# Altium footprint library 6-Connectors-3.PcbLib: 153 footprints (part 5 of 11)
Each footprint in its own frame and in the unit in brackets; x right, y up, seen from the top. Pads: shape width x height; smd on the part's side, far side on the other; paste and mask are expansions set on the pad; w line width, h text height; cw(c..) or ccw(c..) is an arc to the next point about the centre after c.
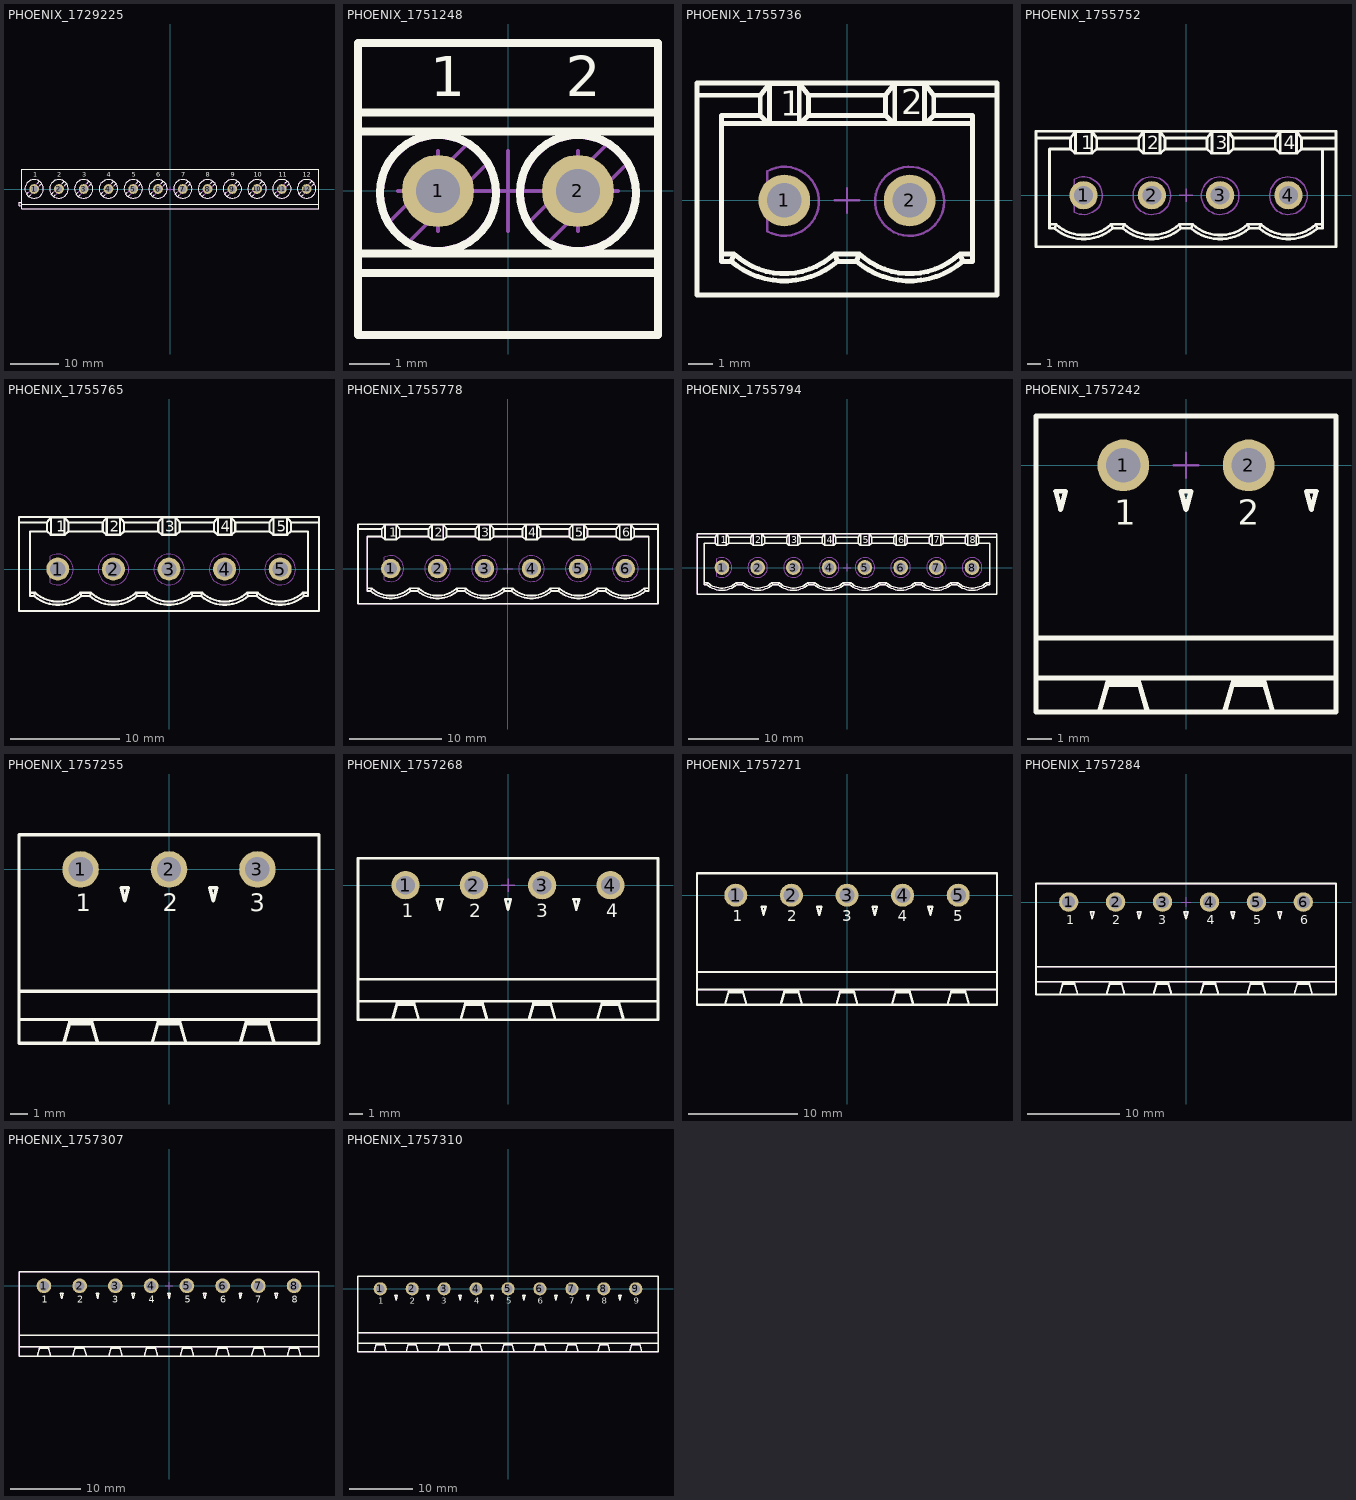
[diagram p4: the footprints below, top view; thin cyan lines are the x and y axes]

## PHOENIX_1729225 [mm] "Terminal Block, 13.5A 400V, Pitch 5.08mm, 12 Positions, Screw Connection"
height 10
pads (12):
  round 2 hole 1.3: 1(-27.94,0) 2(-22.86,0) 3(-17.78,0) 4(-12.7,0) 5(-7.62,0) 6(-2.54,0) 7(2.54,0) 8(7.62,0) 9(12.7,0) 10(17.78,0) 11(22.86,0) 12(27.94,0)
Top Overlay:
  circle w0.2: c27.94,0.05 r1.9
  circle w0.2: c22.86,0.05 r1.9
  circle w0.2: c17.78,0.025 r1.9
  circle w0.2: c12.7,0.025 r1.9
  circle w0.2: c7.62,0.025 r1.9
  circle w0.2: c2.54,0.025 r1.9
  circle w0.2: c-2.54,0.025 r1.9
  circle w0.2: c-7.62,0.025 r1.9
  circle w0.2: c-12.7,0.025 r1.9
  circle w0.2: c-17.78,0.025 r1.9
  circle w0.2: c-22.86,0.025 r1.9
  circle w0.2: c-27.94,0.025 r1.9
  lines w0.2: -30.48,-3.327 -30.609,-3.327 -30.787,-3.477 -31.05,-3.477 -31.05,-2.763 -30.787,-2.763 -30.609,-2.913 -30.48,-2.913 ; -30.48,-3.128 30.48,-3.128 ; -29.508,-1.048 -29.155,-0.695 ; -29.013,-1.543 -28.667,-1.197 ; -27.245,1.215 -26.867,1.593 ; -26.743,0.727 -26.372,1.098 ; -24.428,-1.048 -24.075,-0.695 ; -23.933,-1.543 -23.587,-1.197 ; -22.165,1.215 -21.787,1.593 ; -21.663,0.727 -21.292,1.098 ; -19.348,-1.048 -18.995,-0.695 ; -18.853,-1.543 -18.507,-1.197 ; -17.085,1.215 -16.707,1.593 ; -16.583,0.727 -16.212,1.098 ; -14.268,-1.048 -13.915,-0.695 ; -13.773,-1.543 -13.427,-1.197 ; -12.005,1.215 -11.627,1.593 ; -11.503,0.727 -11.132,1.098 ; -9.188,-1.048 -8.835,-0.695 ; -8.693,-1.543 -8.347,-1.197 ; -6.925,1.215 -6.547,1.593 ; -6.423,0.727 -6.052,1.098 ; -4.108,-1.048 -3.755,-0.695 ; -3.613,-1.543 -3.267,-1.197 ; -1.845,1.215 -1.467,1.593 ; -1.343,0.727 -0.972,1.098 ; 0.972,-1.048 1.325,-0.695 ; 1.467,-1.543 1.813,-1.197 ; 3.235,1.215 3.613,1.593 ; 3.737,0.727 4.108,1.098 ; 6.052,-1.048 6.405,-0.695 ; 6.547,-1.543 6.893,-1.197 ; 8.315,1.215 8.693,1.593 ; 8.817,0.727 9.188,1.098 ; 11.132,-1.048 11.485,-0.695 ; 11.627,-1.543 11.973,-1.197 ; 13.395,1.215 13.773,1.593 ; 13.897,0.727 14.268,1.098 ; 16.212,-1.048 16.565,-0.695 ; 16.707,-1.543 17.053,-1.197 ; 18.475,1.215 18.853,1.593 ; 18.977,0.727 19.348,1.098 ; 21.292,-1.023 21.645,-0.67 ; 21.787,-1.518 22.133,-1.172 ; 23.555,1.24 23.933,1.618 ; 24.057,0.752 24.428,1.123 ; 26.372,-1.023 26.725,-0.67 ; 26.867,-1.518 27.213,-1.172 ; 28.635,1.24 29.013,1.618 ; 29.137,0.752 29.508,1.123 ; -30.48,-4.05 -30.48,4.05 30.48,4.05 30.48,-4.05 -30.48,-4.05
  text "12" at 27.146,2.508 h1
  text "11" at 22.225,2.508 h1
  text "10" at 17.145,2.508 h1
  text "9" at 12.383,2.508 h1
  text "1" at -28.099,2.508 h1
  text "2" at -23.177,2.508 h1
  text "3" at -18.097,2.508 h1
  text "4" at -13.017,2.508 h1
  text "5" at -7.937,2.508 h1
  text "6" at -2.857,2.508 h1
  text "7" at 2.223,2.508 h1
  text "8" at 7.303,2.508 h1
Mechanical 8:
  lines w0.1: -28.44,0 -27.94,0 ; -27.94,-0.5 -27.94,0 ; -27.94,0.5 -27.94,0 ; -27.44,0 -27.94,0 ; -23.36,0 -22.86,0 ; -22.86,-0.5 -22.86,0 ; -22.86,0.5 -22.86,0 ; -22.36,0 -22.86,0 ; -18.28,0 -17.78,0 ; -17.78,-0.5 -17.78,0 ; -17.78,0.5 -17.78,0 ; -17.28,0 -17.78,0 ; -13.2,0 -12.7,0 ; -12.7,-0.5 -12.7,0 ; -12.7,0.5 -12.7,0 ; -12.2,0 -12.7,0 ; -8.12,0 -7.62,0 ; -7.62,-0.5 -7.62,0 ; -7.62,0.5 -7.62,0 ; -7.12,0 -7.62,0 ; -3.04,0 -2.54,0 ; -2.54,-0.5 -2.54,0 ; -2.54,0.5 -2.54,0 ; -2.04,0 -2.54,0 ; -0.5,0 0,0 ; 0,-0.5 0,0 ; 0,0.5 0,0 ; 0.5,0 0,0 ; 2.04,0 2.54,0 ; 2.54,-0.5 2.54,0 ; 2.54,0.5 2.54,0 ; 3.04,0 2.54,0 ; 7.12,0 7.62,0 ; 7.62,-0.5 7.62,0 ; 7.62,0.5 7.62,0 ; 8.12,0 7.62,0 ; 12.2,0 12.7,0 ; 12.7,-0.5 12.7,0 ; 12.7,0.5 12.7,0 ; 13.2,0 12.7,0 ; 17.28,0 17.78,0 ; 17.78,-0.5 17.78,0 ; 17.78,0.5 17.78,0 ; 18.28,0 17.78,0 ; 22.36,0.025 22.86,0.025 ; 22.86,-0.475 22.86,0.025 ; 22.86,0.525 22.86,0.025 ; 23.36,0.025 22.86,0.025 ; 27.44,0.025 27.94,0.025 ; 27.94,-0.475 27.94,0.025 ; 27.94,0.525 27.94,0.025 ; 28.44,0.025 27.94,0.025
Mechanical 14:
  circle w0.1: c27.94,0.025 r1.9
  circle w0.1: c22.86,0.025 r1.9
  circle w0.1: c17.78,0.025 r1.9
  circle w0.1: c12.7,0.025 r1.9
  circle w0.1: c7.62,0.025 r1.9
  circle w0.1: c2.54,0.025 r1.9
  circle w0.1: c-2.54,0.025 r1.9
  circle w0.1: c-7.62,0.025 r1.9
  circle w0.1: c-12.7,0.025 r1.9
  circle w0.1: c-17.78,0.025 r1.9
  circle w0.1: c-22.86,0.025 r1.9
  circle w0.1: c-27.94,0.025 r1.9
  lines w0.1: -30.48,-3.327 -30.609,-3.327 -30.787,-3.477 -31.05,-3.477 -31.05,-2.763 -30.787,-2.763 -30.609,-2.913 -30.48,-2.913 ; -30.48,-3.128 30.48,-3.128 ; -29.508,-1.048 -26.867,1.593 ; -29.013,-1.543 -26.372,1.098 ; -24.428,-1.048 -21.787,1.593 ; -23.933,-1.543 -21.292,1.098 ; -19.348,-1.048 -16.707,1.593 ; -18.853,-1.543 -16.212,1.098 ; -14.268,-1.048 -11.627,1.593 ; -13.773,-1.543 -11.132,1.098 ; -9.188,-1.048 -6.547,1.593 ; -8.693,-1.543 -6.052,1.098 ; -4.108,-1.048 -1.467,1.593 ; -3.613,-1.543 -0.972,1.098 ; 0.972,-1.048 3.613,1.593 ; 1.467,-1.543 4.108,1.098 ; 6.052,-1.048 8.693,1.593 ; 6.547,-1.543 9.188,1.098 ; 11.132,-1.048 13.773,1.593 ; 11.627,-1.543 14.268,1.098 ; 16.212,-1.048 18.853,1.593 ; 16.707,-1.543 19.348,1.098 ; 21.292,-1.048 23.933,1.593 ; 21.787,-1.543 24.428,1.098 ; 26.372,-1.048 29.013,1.593 ; 26.867,-1.543 29.508,1.098 ; -30.48,-4.05 -30.48,4.05 30.48,4.05 30.48,-4.05 -30.48,-4.05
  text "12" at 27.146,2.508 h1
  text "11" at 22.225,2.508 h1
  text "10" at 17.145,2.508 h1
  text "9" at 12.383,2.508 h1
  text "1" at -28.099,2.508 h1
  text "2" at -23.177,2.508 h1
  text "3" at -18.097,2.508 h1
  text "4" at -13.017,2.508 h1
  text "5" at -7.937,2.508 h1
  text "6" at -2.857,2.508 h1
  text "7" at 2.223,2.508 h1
  text "8" at 7.303,2.508 h1
3D body "PHOENIX_1729225.stp": height 10, standoff -3.5, extent -31.05,-4.05 30.48,4.05

## PHOENIX_1751248 [mm] "Terminal Block, 10A 160V, Pitch 3.5mm, 2 Positions, Screw Connection"
height 8.5
pads (2):
  round 1.8 hole 1.1: 1(-1.75,0) 2(1.75,0)
Top Overlay:
  circle w0.2: c1.75,-0.05 r1.45
  circle w0.2: c-1.75,-0.05 r1.45
  lines w0.2: -3.75,-2.049 3.75,-2.049 ; -3.75,-1.566 3.75,-1.566 ; -3.75,1.487 3.75,1.487 ; -3.75,1.962 3.75,1.962 ; -3.75,-3.6 -3.75,3.7 3.75,3.7 3.75,-3.6 -3.75,-3.6
  text "1" at -1.95,2.375 h1
  text "2" at 1.45,2.375 h1
Mechanical 8:
  lines w0.1: -2.75,0 -1.75,0 ; -1.75,-1 -1.75,0 ; -1.75,1 -1.75,0 ; -1,0 0,0 ; -0.75,0 -1.75,0 ; 0,-1 0,0 ; 0,1 0,0 ; 0.75,0 1.75,0 ; 1,0 0,0 ; 1.75,-1 1.75,0 ; 1.75,1 1.75,0 ; 2.75,0 1.75,0
Mechanical 14:
  circle w0.1: c1.75,-0.05 r1.4
  circle w0.1: c-1.75,-0.05 r1.4
  circle w0.1: c1.75,-0.05 r1.45
  circle w0.1: c-1.75,-0.05 r1.45
  lines w0.1: -3.75,-2.049 3.75,-2.049 ; -3.75,-1.566 3.75,-1.566 ; -3.75,1.487 3.75,1.487 ; -3.75,1.962 3.75,1.962 ; -2.956,-0.761 -1.039,1.156 ; -2.461,-1.256 -0.544,0.661 ; 0.544,-0.761 2.461,1.156 ; 1.039,-1.256 2.956,0.661 ; -3.75,-3.6 -3.75,3.7 3.75,3.7 3.75,-3.6 -3.75,-3.6
3D body "PHOENIX_1751248.stp": height 8.5, standoff -3.5, extent -3.75,-3.6 3.75,3.7

## PHOENIX_1755736 [mm] "PCB Header, 12A 250 V, Pitch: 2.54mm, 2 Positions, MSTBVA Serie"
height 12
pads (2):
  round 2.1 hole 1.4: 1(-2.54,0) 2(2.54,0)
Top Overlay:
  lines w0.2: -6.08,4.265 -3.515,4.265 ; -5.08,-2.165 -4.58,-2.165 ; -5.08,3.128 5.08,3.128 ; -3.145,3.128 -3.145,4.738 ; -1.935,3.128 -1.935,4.738 ; 1.935,3.128 1.935,4.738 ; 3.145,3.128 3.145,4.738 ; 5.08,-2.165 4.58,-2.165 ; 6.08,4.265 3.515,4.265 ; -4.694,-2.465 ccw(c-2.54,0.036) -0.386,-2.465 ; -4.694,-2.465 -4.58,-2.165 ; -4.694,-2.465 -5.08,-2.465 -5.08,3.44 -3.515,3.44 ; -4.58,-2.165 ccw(c-2.54,0.033) -0.5,-2.165 ; -3.515,3.44 -3.184,3.128 -1.896,3.128 -1.565,3.44 ; -3.515,3.44 -3.515,4.265 ; -3.515,4.265 -3.145,4.738 ; -3.145,4.738 -1.935,4.738 ; -1.935,4.738 -1.565,4.265 ; -1.565,3.44 -1.565,4.265 ; -1.565,3.44 1.565,3.44 ; -1.565,4.265 1.565,4.265 ; -0.5,-2.165 0.5,-2.165 ; -0.5,-2.165 -0.386,-2.465 ; -0.386,-2.465 0.386,-2.465 ; 0.386,-2.465 ccw(c2.54,0.036) 4.694,-2.465 ; 0.386,-2.465 0.5,-2.165 ; 0.5,-2.165 ccw(c2.54,0.033) 4.58,-2.165 ; 1.565,3.44 1.565,4.265 ; 1.565,3.44 1.896,3.128 3.184,3.128 3.515,3.44 ; 1.565,4.265 1.935,4.738 ; 1.935,4.738 3.145,4.738 ; 3.145,4.738 3.515,4.265 ; 3.515,3.44 3.515,4.265 ; 3.515,3.44 5.08,3.44 5.08,-2.465 4.694,-2.465 ; 4.58,-2.165 4.694,-2.465 ; -6.08,-3.835 -6.08,4.765 6.08,4.765 6.08,-3.835 -6.08,-3.835
  text "2" at 2.2,3.5 h1
  text "1" at -2.7,3.425 h1
Mechanical 8:
  lines w0.1: -3.04,0 -2.54,0 ; -2.54,-0.5 -2.54,0 ; -2.54,0.5 -2.54,0 ; -2.04,0 -2.54,0 ; -0.5,0 0,0 ; 0,-0.5 0,0 ; 0,0.5 0,0 ; 0.5,0 0,0 ; 2.04,0 2.54,0 ; 2.54,-0.5 2.54,0 ; 2.54,0.5 2.54,0 ; 3.04,0 2.54,0
Mechanical 14:
  circle w0.1: c2.54,-0.035 r1.4
  lines w0.1: -6.08,4.265 -3.515,4.265 ; -5.08,-2.165 -4.58,-2.165 ; -5.08,3.128 5.08,3.128 ; -3.145,3.128 -3.145,4.738 ; -1.935,3.128 -1.935,4.738 ; 1.935,3.128 1.935,4.738 ; 3.145,3.128 3.145,4.738 ; 5.08,-2.165 4.58,-2.165 ; 6.08,4.265 3.515,4.265 ; -4.694,-2.465 ccw(c-2.54,0.036) -0.386,-2.465 ; -4.694,-2.465 -4.58,-2.165 ; -4.694,-2.465 -5.08,-2.465 -5.08,3.44 -3.515,3.44 ; -4.58,-2.165 ccw(c-2.54,0.033) -0.5,-2.165 ; -3.515,3.44 -3.184,3.128 -1.896,3.128 -1.565,3.44 ; -3.515,3.44 -3.515,4.265 ; -3.515,4.265 -3.145,4.738 ; -3.145,4.738 -1.935,4.738 ; -3.04,-0.535 -2.772,-0.267 ; -3.04,-0.535 -3.04,0.465 ; -3.04,-0.535 -2.04,-0.535 ; -3.04,0.465 -2.772,0.197 ; -3.04,0.465 -2.04,0.465 ; -2.772,-0.267 -2.772,0.197 ; -2.772,-0.267 -2.308,-0.267 ; -2.772,0.197 -2.308,0.197 ; -2.308,-0.267 -2.308,0.197 ; -2.308,-0.267 -2.04,-0.535 ; -2.308,0.197 -2.04,0.465 ; -2.04,-0.535 -2.04,0.465 ; -1.935,4.738 -1.565,4.265 ; -1.565,3.44 -1.565,4.265 ; -1.565,3.44 1.565,3.44 ; -1.565,4.265 1.565,4.265 ; -0.5,-2.165 0.5,-2.165 ; -0.5,-2.165 -0.386,-2.465 ; -0.386,-2.465 0.386,-2.465 ; 0.386,-2.465 ccw(c2.54,0.036) 4.694,-2.465 ; 0.386,-2.465 0.5,-2.165 ; 0.5,-2.165 ccw(c2.54,0.033) 4.58,-2.165 ; 1.565,3.44 1.565,4.265 ; 1.565,3.44 1.896,3.128 3.184,3.128 3.515,3.44 ; 1.565,4.265 1.935,4.738 ; 1.935,4.738 3.145,4.738 ; 2.04,-0.535 2.308,-0.267 ; 2.04,-0.535 2.04,0.465 ; 2.04,-0.535 3.04,-0.535 ; 2.04,0.465 2.308,0.197 ; 2.04,0.465 3.04,0.465 ; 2.308,-0.267 2.308,0.197 ; 2.308,-0.267 2.772,-0.267 ; 2.308,0.197 2.772,0.197 ; 2.772,-0.267 2.772,0.197 ; 2.772,-0.267 3.04,-0.535 ; 2.772,0.197 3.04,0.465 ; 3.04,-0.535 3.04,0.465 ; 3.145,4.738 3.515,4.265 ; 3.515,3.44 3.515,4.265 ; 3.515,3.44 5.08,3.44 5.08,-2.465 4.694,-2.465 ; 4.58,-2.165 4.694,-2.465 ; -6.08,-3.835 -6.08,4.765 6.08,4.765 6.08,-3.835 -6.08,-3.835 ; -3.24,-1.247 ccw(c-2.54,-0.035) -3.24,1.177 -3.24,-1.247
  text "1" at -2.7,3.425 h1
  text "2" at 2.2,3.5 h1
3D body "PHOENIX_1755736.stp": height 12, standoff -3.9, extent -6.08,-3.835 6.08,4.765

## PHOENIX_1755752 [mm] "PCB Header, 12A 250 V, Pitch: 2.54mm, 4 Positions, MSTBVA Serie"
height 12
pads (4):
  round 2.1 hole 1.4: 1(-7.62,0) 2(-2.54,0) 3(2.54,0) 4(7.62,0)
Top Overlay:
  lines w0.2: -11.16,4.265 -8.595,4.265 ; -10.16,-2.165 -9.66,-2.165 ; -8.225,3.128 -8.225,4.738 ; -7.015,3.128 -7.015,4.738 ; -3.145,3.128 -3.145,4.738 ; -1.935,3.128 -1.935,4.738 ; 1.935,3.128 1.935,4.738 ; 3.145,3.128 3.145,4.738 ; 7.015,3.128 7.015,4.738 ; 8.225,3.128 8.225,4.738 ; 10.16,-2.165 9.66,-2.165 ; 10.16,3.44 10.16,-2.465 9.774,-2.465 ; 11.16,3.44 8.595,3.44 ; 11.16,4.265 8.595,4.265 ; -9.774,-2.465 ccw(c-7.62,0.036) -5.466,-2.465 ; -9.774,-2.465 -10.16,-2.465 -10.16,3.44 -8.595,3.44 ; -9.774,-2.465 -9.66,-2.165 ; -9.66,-2.165 ccw(c-7.62,0.033) -5.58,-2.165 ; -8.595,3.44 -8.595,4.265 ; -8.595,3.44 -8.264,3.128 -6.976,3.128 -6.645,3.44 ; -8.595,4.265 -8.225,4.738 ; -8.225,4.738 -7.015,4.738 ; -7.015,4.738 -6.645,4.265 ; -6.645,3.44 -3.515,3.44 ; -6.645,3.44 -6.645,4.265 ; -6.645,4.265 -3.515,4.265 ; -5.58,-2.165 -5.466,-2.465 ; -5.58,-2.165 -4.58,-2.165 ; -5.466,-2.465 -4.694,-2.465 ; -4.694,-2.465 ccw(c-2.54,0.036) -0.386,-2.465 ; -4.694,-2.465 -4.58,-2.165 ; -4.58,-2.165 ccw(c-2.54,0.033) -0.5,-2.165 ; -3.515,3.44 -3.184,3.128 -1.896,3.128 -1.565,3.44 ; -3.515,3.44 -3.515,4.265 ; -3.515,4.265 -3.145,4.738 ; -3.145,4.738 -1.935,4.738 ; -1.935,4.738 -1.565,4.265 ; -1.565,3.44 -1.565,4.265 ; -1.565,3.44 1.565,3.44 ; -1.565,4.265 1.565,4.265 ; -0.5,-2.165 -0.386,-2.465 ; -0.5,-2.165 0.5,-2.165 ; -0.386,-2.465 0.386,-2.465 ; 0.386,-2.465 ccw(c2.54,0.036) 4.694,-2.465 ; 0.386,-2.465 0.5,-2.165 ; 0.5,-2.165 ccw(c2.54,0.033) 4.58,-2.165 ; 1.565,3.44 1.896,3.128 3.184,3.128 3.515,3.44 ; 1.565,3.44 1.565,4.265 ; 1.565,4.265 1.935,4.738 ; 1.935,4.738 3.145,4.738 ; 3.145,4.738 3.515,4.265 ; 3.515,3.44 3.515,4.265 ; 3.515,3.44 6.645,3.44 ; 3.515,4.265 6.645,4.265 ; 4.58,-2.165 4.694,-2.465 ; 4.58,-2.165 5.58,-2.165 ; 4.694,-2.465 5.466,-2.465 ; 5.466,-2.465 ccw(c7.62,0.036) 9.774,-2.465 ; 5.466,-2.465 5.58,-2.165 ; 5.58,-2.165 ccw(c7.62,0.033) 9.66,-2.165 ; 6.645,3.44 6.976,3.128 8.264,3.128 8.595,3.44 ; 6.645,3.44 6.645,4.265 ; 6.645,4.265 7.015,4.738 ; 7.015,4.738 8.225,4.738 ; 8.225,4.738 8.595,4.265 ; 8.595,3.44 8.595,4.265 ; 9.66,-2.165 9.774,-2.465 ; -11.16,-3.835 11.16,-3.835 11.16,4.765 -11.16,4.765 -11.16,-3.835
  text "4" at 7.285,3.425 h1
  text "3" at 2.205,3.425 h1
  text "2" at -2.875,3.425 h1
  text "1" at -7.78,3.425 h1
Mechanical 8:
  lines w0.1: -3.04,0 -2.54,0 ; -2.54,-0.5 -2.54,0 ; -2.54,0.5 -2.54,0 ; -2.04,0 -2.54,0 ; -0.5,0 0,0 ; 0,-0.5 0,0 ; 0,0.5 0,0 ; 0.5,0 0,0 ; 2.04,0 2.54,0 ; 2.54,-0.5 2.54,0 ; 2.54,0.5 2.54,0 ; 3.04,0 2.54,0 ; 7.12,0 7.62,0 ; 7.62,-0.5 7.62,0 ; 7.62,0.5 7.62,0 ; 8.12,0 7.62,0 ; -7.62,0 -8.12,0 -7.62,0 ; -7.62,0 -7.62,0.5 -7.62,0 ; -7.62,0 -7.12,0 -7.62,0 ; -7.62,0 -7.62,-0.5 -7.62,0
Mechanical 14:
  circle w0.1: c-2.54,-0.035 r1.4
  circle w0.1: c2.54,-0.035 r1.4
  circle w0.1: c7.62,-0.035 r1.4
  lines w0.1: -11.16,4.265 -8.595,4.265 ; -10.16,-2.165 -9.66,-2.165 ; -8.225,3.128 -8.225,4.738 ; -7.015,3.128 -7.015,4.738 ; -3.145,3.128 -3.145,4.738 ; -1.935,3.128 -1.935,4.738 ; 1.935,3.128 1.935,4.738 ; 3.145,3.128 3.145,4.738 ; 7.015,3.128 7.015,4.738 ; 8.225,3.128 8.225,4.738 ; 10.16,-2.165 9.66,-2.165 ; 10.16,3.44 10.16,-2.465 9.774,-2.465 ; 11.16,3.44 8.595,3.44 ; 11.16,4.265 8.595,4.265 ; -9.774,-2.465 ccw(c-7.62,0.036) -5.466,-2.465 ; -9.774,-2.465 -10.16,-2.465 -10.16,3.44 -8.595,3.44 ; -9.774,-2.465 -9.66,-2.165 ; -9.66,-2.165 ccw(c-7.62,0.033) -5.58,-2.165 ; -8.595,3.44 -8.595,4.265 ; -8.595,3.44 -8.264,3.128 -6.976,3.128 -6.645,3.44 ; -8.595,4.265 -8.225,4.738 ; -8.225,4.738 -7.015,4.738 ; -8.12,-0.535 -7.12,-0.535 ; -8.12,-0.535 -8.12,0.465 ; -8.12,-0.535 -7.852,-0.267 ; -8.12,0.465 -7.12,0.465 ; -8.12,0.465 -7.852,0.197 ; -7.852,-0.267 -7.388,-0.267 ; -7.852,-0.267 -7.852,0.197 ; -7.852,0.197 -7.388,0.197 ; -7.388,-0.267 -7.12,-0.535 ; -7.388,-0.267 -7.388,0.197 ; -7.388,0.197 -7.12,0.465 ; -7.12,-0.535 -7.12,0.465 ; -7.015,4.738 -6.645,4.265 ; -6.645,3.44 -3.515,3.44 ; -6.645,3.44 -6.645,4.265 ; -6.645,4.265 -3.515,4.265 ; -5.58,-2.165 -5.466,-2.465 ; -5.58,-2.165 -4.58,-2.165 ; -5.466,-2.465 -4.694,-2.465 ; -4.694,-2.465 ccw(c-2.54,0.036) -0.386,-2.465 ; -4.694,-2.465 -4.58,-2.165 ; -4.58,-2.165 ccw(c-2.54,0.033) -0.5,-2.165 ; -3.515,3.44 -3.184,3.128 -1.896,3.128 -1.565,3.44 ; -3.515,3.44 -3.515,4.265 ; -3.515,4.265 -3.145,4.738 ; -3.145,4.738 -1.935,4.738 ; -3.04,-0.535 -2.04,-0.535 ; -3.04,-0.535 -3.04,0.465 ; -3.04,-0.535 -2.772,-0.267 ; -3.04,0.465 -2.04,0.465 ; -3.04,0.465 -2.772,0.197 ; -2.772,-0.267 -2.308,-0.267 ; -2.772,-0.267 -2.772,0.197 ; -2.772,0.197 -2.308,0.197 ; -2.308,-0.267 -2.04,-0.535 ; -2.308,-0.267 -2.308,0.197 ; -2.308,0.197 -2.04,0.465 ; -2.04,-0.535 -2.04,0.465 ; -1.935,4.738 -1.565,4.265 ; -1.565,3.44 -1.565,4.265 ; -1.565,3.44 1.565,3.44 ; -1.565,4.265 1.565,4.265 ; -0.5,-2.165 -0.386,-2.465 ; -0.5,-2.165 0.5,-2.165 ; -0.386,-2.465 0.386,-2.465 ; 0.386,-2.465 ccw(c2.54,0.036) 4.694,-2.465 ; 0.386,-2.465 0.5,-2.165 ; 0.5,-2.165 ccw(c2.54,0.033) 4.58,-2.165 ; 1.565,3.44 1.896,3.128 3.184,3.128 3.515,3.44 ; 1.565,3.44 1.565,4.265 ; 1.565,4.265 1.935,4.738 ; 1.935,4.738 3.145,4.738 ; 2.04,-0.535 3.04,-0.535 ; 2.04,-0.535 2.04,0.465 ; 2.04,-0.535 2.308,-0.267 ; 2.04,0.465 3.04,0.465 ; 2.04,0.465 2.308,0.197 ; 2.308,-0.267 2.772,-0.267 ; 2.308,-0.267 2.308,0.197 ; 2.308,0.197 2.772,0.197 ; 2.772,-0.267 3.04,-0.535 ; 2.772,-0.267 2.772,0.197 ; 2.772,0.197 3.04,0.465 ; 3.04,-0.535 3.04,0.465 ; 3.145,4.738 3.515,4.265 ; 3.515,3.44 3.515,4.265 ; 3.515,3.44 6.645,3.44 ; 3.515,4.265 6.645,4.265 ; 4.58,-2.165 4.694,-2.465 ; 4.58,-2.165 5.58,-2.165 ; 4.694,-2.465 5.466,-2.465 ; 5.466,-2.465 ccw(c7.62,0.036) 9.774,-2.465 ; 5.466,-2.465 5.58,-2.165 ; 5.58,-2.165 ccw(c7.62,0.033) 9.66,-2.165 ; 6.645,3.44 6.976,3.128 8.264,3.128 8.595,3.44 ; 6.645,3.44 6.645,4.265 ; 6.645,4.265 7.015,4.738 ; 7.015,4.738 8.225,4.738 ; 7.12,-0.535 8.12,-0.535 ; 7.12,-0.535 7.12,0.465 ; 7.12,-0.535 7.388,-0.267 ; 7.12,0.465 8.12,0.465 ; 7.12,0.465 7.388,0.197 ; 7.388,-0.267 7.852,-0.267 ; 7.388,-0.267 7.388,0.197 ; 7.388,0.197 7.852,0.197 ; 7.852,-0.267 8.12,-0.535 ; 7.852,-0.267 7.852,0.197 ; 7.852,0.197 8.12,0.465 ; 8.12,-0.535 8.12,0.465 ; 8.225,4.738 8.595,4.265 ; 8.595,3.44 8.595,4.265 ; 9.66,-2.165 9.774,-2.465 ; -11.16,-3.835 11.16,-3.835 11.16,4.765 -11.16,4.765 -11.16,-3.835 ; -8.32,-1.247 ccw(c-7.62,-0.035) -8.32,1.177 -8.32,-1.247
  text "4" at 7.285,3.425 h1
  text "3" at 2.205,3.425 h1
  text "2" at -2.875,3.425 h1
  text "1" at -7.78,3.425 h1
3D body "PHOENIX_1755752.stp": height 12, standoff -3.9, extent -11.16,-3.835 11.16,4.765

## PHOENIX_1755765 [mm] "PCB Header, 12A 250 V, Pitch: 2.54mm, 5 Positions, MSTBVA Serie"
height 12
pads (5):
  round 2.1 hole 1.4: 1(-10.16,0) 2(-5.08,0) 3(0,0) 4(5.08,0) 5(10.16,0)
Top Overlay:
  lines w0.2: -13.7,4.265 -11.135,4.265 ; -12.7,-2.165 -12.2,-2.165 ; -10.765,3.128 -10.765,4.738 ; -9.555,3.128 -9.555,4.738 ; -5.685,3.128 -5.685,4.738 ; -4.475,3.128 -4.475,4.738 ; -0.605,3.128 -0.605,4.738 ; 0.605,3.128 0.605,4.738 ; 4.475,3.128 4.475,4.738 ; 5.685,3.128 5.685,4.738 ; 9.555,3.128 9.555,4.738 ; 10.765,3.128 10.765,4.738 ; 12.7,-2.165 12.2,-2.165 ; 13.7,4.265 11.135,4.265 ; -12.314,-2.465 ccw(c-10.16,0.036) -8.006,-2.465 ; -12.314,-2.465 -12.7,-2.465 -12.7,3.44 -11.135,3.44 ; -12.314,-2.465 -12.2,-2.165 ; -12.2,-2.165 ccw(c-10.16,0.033) -8.12,-2.165 ; -11.135,3.44 -11.135,4.265 ; -11.135,3.44 -10.804,3.128 -9.516,3.128 -9.185,3.44 ; -11.135,4.265 -10.765,4.738 ; -10.765,4.738 -9.555,4.738 ; -9.555,4.738 -9.185,4.265 ; -9.185,3.44 -6.055,3.44 ; -9.185,3.44 -9.185,4.265 ; -9.185,4.265 -6.055,4.265 ; -8.12,-2.165 -8.006,-2.465 ; -8.12,-2.165 -7.12,-2.165 ; -8.006,-2.465 -7.234,-2.465 ; -7.234,-2.465 ccw(c-5.08,0.036) -2.926,-2.465 ; -7.234,-2.465 -7.12,-2.165 ; -7.12,-2.165 ccw(c-5.08,0.033) -3.04,-2.165 ; -6.055,3.44 -5.724,3.128 -4.436,3.128 -4.105,3.44 ; -6.055,3.44 -6.055,4.265 ; -6.055,4.265 -5.685,4.738 ; -5.685,4.738 -4.475,4.738 ; -4.475,4.738 -4.105,4.265 ; -4.105,3.44 -4.105,4.265 ; -4.105,3.44 -0.975,3.44 ; -4.105,4.265 -0.975,4.265 ; -3.04,-2.165 -2.926,-2.465 ; -3.04,-2.165 -2.04,-2.165 ; -2.926,-2.465 -2.154,-2.465 ; -2.154,-2.465 ccw(c0,0.036) 2.154,-2.465 ; -2.154,-2.465 -2.04,-2.165 ; -2.04,-2.165 ccw(c0,0.033) 2.04,-2.165 ; -0.975,3.44 -0.644,3.128 0.644,3.128 0.975,3.44 ; -0.975,3.44 -0.975,4.265 ; -0.975,4.265 -0.605,4.738 ; -0.605,4.738 0.605,4.738 ; 0.605,4.738 0.975,4.265 ; 0.975,3.44 0.975,4.265 ; 0.975,3.44 4.105,3.44 ; 0.975,4.265 4.105,4.265 ; 2.04,-2.165 2.154,-2.465 ; 2.04,-2.165 3.04,-2.165 ; 2.154,-2.465 2.926,-2.465 ; 2.926,-2.465 ccw(c5.08,0.036) 7.234,-2.465 ; 2.926,-2.465 3.04,-2.165 ; 3.04,-2.165 ccw(c5.08,0.033) 7.12,-2.165 ; 4.105,3.44 4.436,3.128 5.724,3.128 6.055,3.44 ; 4.105,3.44 4.105,4.265 ; 4.105,4.265 4.475,4.738 ; 4.475,4.738 5.685,4.738 ; 5.685,4.738 6.055,4.265 ; 6.055,3.44 6.055,4.265 ; 6.055,3.44 9.185,3.44 ; 6.055,4.265 9.185,4.265 ; 7.12,-2.165 7.234,-2.465 ; 7.12,-2.165 8.12,-2.165 ; 7.234,-2.465 8.006,-2.465 ; 8.006,-2.465 ccw(c10.16,0.036) 12.314,-2.465 ; 8.006,-2.465 8.12,-2.165 ; 8.12,-2.165 ccw(c10.16,0.033) 12.2,-2.165 ; 9.185,3.44 9.516,3.128 10.804,3.128 11.135,3.44 ; 9.185,3.44 9.185,4.265 ; 9.185,4.265 9.555,4.738 ; 9.555,4.738 10.765,4.738 ; 10.765,4.738 11.135,4.265 ; 11.135,3.44 11.135,4.265 ; 11.135,3.44 12.7,3.44 12.7,-2.465 12.314,-2.465 ; 12.2,-2.165 12.314,-2.465 ; -13.7,-3.835 13.7,-3.835 13.7,4.765 -13.7,4.765 -13.7,-3.835
  text "5" at 9.825,3.425 h1
  text "4" at 4.745,3.425 h1
  text "3" at -0.335,3.425 h1
  text "2" at -5.415,3.425 h1
  text "1" at -10.32,3.425 h1
Mechanical 8:
  lines w0.1: -10.66,0 -10.16,0 ; -10.16,-0.5 -10.16,0 ; -10.16,0.5 -10.16,0 ; -9.66,0 -10.16,0 ; -5.58,0 -5.08,0 ; -5.08,-0.5 -5.08,0 ; -5.08,0.5 -5.08,0 ; -4.58,0 -5.08,0 ; 4.58,0 5.08,0 ; 5.08,-0.5 5.08,0 ; 5.08,0.5 5.08,0 ; 5.58,0 5.08,0 ; 9.66,0 10.16,0 ; 10.16,-0.5 10.16,0 ; 10.16,0.5 10.16,0 ; 10.66,0 10.16,0 ; 0,0 0,0.5 0,0 ; 0,0 0.5,0 0,0 ; 0,0 0,-0.5 0,0 ; 0,0 -0.5,0 0,0
Mechanical 14:
  drawing of 166 lines, arcs and shapes, not listed
  text "5" at 9.825,3.425 h1
  text "4" at 4.745,3.425 h1
  text "3" at -0.335,3.425 h1
  text "2" at -5.415,3.425 h1
  text "1" at -10.32,3.425 h1
3D body "PHOENIX_1755765.stp": height 12, standoff -3.9, extent -13.7,-3.835 13.7,4.765

## PHOENIX_1755778 [mm] "PCB Header, 12A 250 V, Pitch: 2.54mm, 6 Positions, MSTBVA Serie"
height 12
pads (6):
  round 2.1 hole 1.4: 1(-12.7,0) 2(-7.62,0) 3(-2.54,0) 4(2.54,0) 5(7.62,0) 6(12.7,0)
Top Overlay:
  lines w0.2: -16.24,4.3 -13.675,4.3 ; -15.24,-2.13 -14.74,-2.13 ; -13.305,3.163 -13.305,4.773 ; -12.095,3.163 -12.095,4.773 ; -10.546,-2.43 -10.66,-2.13 ; -9.774,-2.43 ccw(c-7.62,0.071) -5.466,-2.43 -5.58,-2.13 ; -8.225,3.163 -8.225,4.773 ; -7.015,3.163 -7.015,4.773 ; -5.466,-2.43 -4.694,-2.43 -4.58,-2.13 ; -4.694,-2.43 ccw(c-2.54,0.071) -0.386,-2.43 -0.5,-2.13 ; -3.145,3.163 -3.145,4.773 ; -1.935,3.163 -1.935,4.773 ; -0.386,-2.43 0.386,-2.43 0.5,-2.13 ; 0.386,-2.43 ccw(c2.54,0.071) 4.694,-2.43 4.58,-2.13 ; 1.935,3.163 1.935,4.773 ; 3.145,3.163 3.145,4.773 ; 4.694,-2.43 5.466,-2.43 5.58,-2.13 ; 5.466,-2.43 ccw(c7.62,0.071) 9.774,-2.43 9.66,-2.13 ; 9.774,-2.43 10.546,-2.43 10.66,-2.13 ; 10.546,-2.43 ccw(c12.7,0.071) 14.854,-2.43 ; 12.095,3.163 12.095,4.773 ; 13.305,3.163 13.305,4.773 ; 15.24,-2.13 14.74,-2.13 ; 16.24,4.3 13.675,4.3 ; -14.854,-2.43 ccw(c-12.7,0.071) -10.546,-2.43 -9.774,-2.43 -9.66,-2.13 ; -14.854,-2.43 -14.74,-2.13 ; -14.854,-2.43 -15.24,-2.43 -15.24,3.475 -13.675,3.475 ; -14.74,-2.13 ccw(c-12.7,0.068) -10.66,-2.13 ; -13.675,3.475 -13.344,3.163 -12.056,3.163 -11.725,3.475 ; -13.675,3.475 -13.675,4.3 ; -13.675,4.3 -13.305,4.773 ; -13.305,4.773 -12.095,4.773 ; -12.095,4.773 -11.725,4.3 ; -11.725,3.475 -11.725,4.3 ; -11.725,3.475 -8.595,3.475 ; -11.725,4.3 -8.595,4.3 ; -10.66,-2.13 -9.66,-2.13 ; -9.66,-2.13 ccw(c-7.62,0.068) -5.58,-2.13 ; -8.595,3.475 -8.595,4.3 ; -8.595,3.475 -8.264,3.163 -6.976,3.163 -6.645,3.475 ; -8.595,4.3 -8.225,4.773 ; -8.225,4.773 -7.015,4.773 ; -7.015,4.773 -6.645,4.3 ; -6.645,3.475 -3.515,3.475 ; -6.645,3.475 -6.645,4.3 ; -6.645,4.3 -3.515,4.3 ; -5.58,-2.13 -4.58,-2.13 ; -4.58,-2.13 ccw(c-2.54,0.068) -0.5,-2.13 ; -3.515,3.475 -3.515,4.3 ; -3.515,3.475 -3.184,3.163 -1.896,3.163 -1.565,3.475 ; -3.515,4.3 -3.145,4.773 ; -3.145,4.773 -1.935,4.773 ; -1.935,4.773 -1.565,4.3 ; -1.565,3.475 1.565,3.475 ; -1.565,3.475 -1.565,4.3 ; -1.565,4.3 1.565,4.3 ; -0.5,-2.13 0.5,-2.13 ; 0.5,-2.13 ccw(c2.54,0.068) 4.58,-2.13 ; 1.565,3.475 1.565,4.3 ; 1.565,3.475 1.896,3.163 3.184,3.163 3.515,3.475 ; 1.565,4.3 1.935,4.773 ; 1.935,4.773 3.145,4.773 ; 3.145,4.773 3.515,4.3 ; 3.515,3.475 6.645,3.475 ; 3.515,3.475 3.515,4.3 ; 3.515,4.3 6.645,4.3 ; 4.58,-2.13 5.58,-2.13 ; 5.58,-2.13 ccw(c7.62,0.068) 9.66,-2.13 ; 6.645,3.475 6.645,4.3 ; 6.645,3.475 6.976,3.163 ; 6.645,3.475 6.976,3.163 ; 6.645,3.475 6.645,4.3 ; 6.645,4.3 7.015,4.773 ; 6.645,4.3 7.015,4.773 ; 6.976,3.163 8.264,3.163 ; 6.976,3.163 8.264,3.163 ; 7.015,4.773 7.015,3.163 7.015,4.773 ; 7.015,4.773 8.225,4.773 ; 7.015,4.773 8.225,4.773 ; 8.225,4.773 8.225,3.163 8.225,4.773 ; 8.225,4.773 8.595,4.3 ; 8.225,4.773 8.595,4.3 ; 8.264,3.163 8.595,3.475 ; 8.264,3.163 8.595,3.475 ; 8.595,3.475 11.725,3.475 ; 8.595,3.475 8.595,4.3 ; 8.595,3.475 8.595,4.3 ; 8.595,4.3 11.725,4.3 ; 9.66,-2.13 10.66,-2.13 ; 10.661,-2.13 ccw(c12.7,0.068) 14.74,-2.13 ; 11.725,3.475 11.725,4.3 ; 11.725,3.475 12.056,3.163 13.344,3.163 13.675,3.475 ; 11.725,4.3 12.095,4.773 ; 12.095,4.773 13.305,4.773 ; 13.305,4.773 13.675,4.3 ; 13.675,3.475 15.24,3.475 15.24,-2.43 14.854,-2.43 ; 13.675,3.475 13.675,4.3 ; 14.74,-2.13 14.854,-2.43 ; -16.24,-3.8 -16.24,4.8 16.24,4.8 16.24,-3.8 -16.24,-3.8